# Altium footprint library csy.PcbLib: 198 footprints (part 7 of 13)
Each footprint in its own frame and in the unit in brackets; x right, y up, seen from the top. Pads: shape width x height; smd on the part's side, far side on the other; paste and mask are expansions set on the pad; w line width, h text height; cw(c..) or ccw(c..) is an arc to the next point about the centre after c.
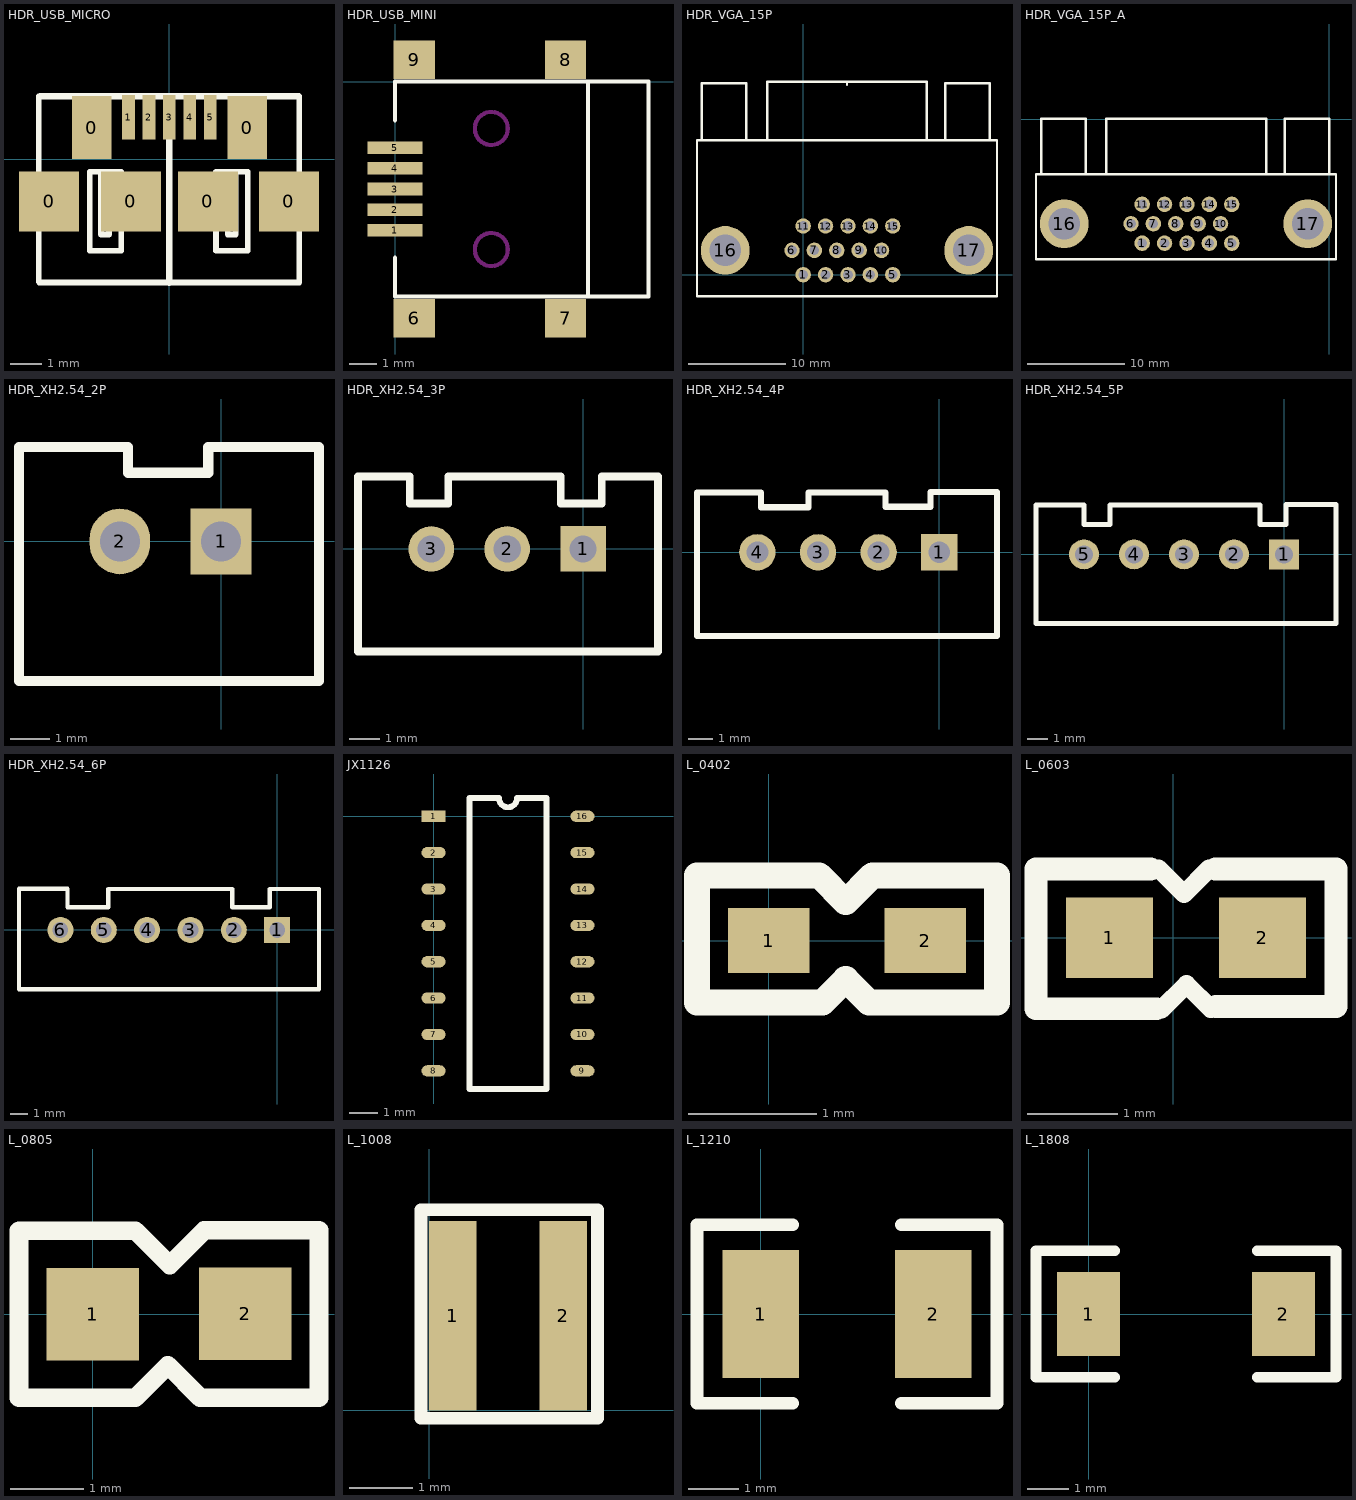
[diagram p6: the footprints below, top view; thin cyan lines are the x and y axes]

## HDR_USB_MICRO [mm]
pads (11):
  rect 1.9x1.9 smd: 0(-3.797,-1.333) 0(-1.206,-1.333) 0(1.232,-1.333) 0(3.797,-1.333)
  rect 1.25x2 smd: 0(-2.451,1.003) 0(2.476,1.003)
  rect 0.4x1.4 smd: 1(-1.283,1.333) 2(-0.635,1.333) 3(0.013,1.333) 4(0.66,1.333) 5(1.308,1.333)
Top Overlay:
  lines w0.178: -4.127,-3.873 -4.127,1.994 ; -4.102,-3.899 4.102,-3.899 ; -2.152,-0.394 -2.152,-2.379 -1.949,-2.379 -1.898,-2.379 -1.898,-0.394 ; 1.861,-0.394 1.861,-2.379 2.115,-2.379 2.115,-0.394 ; 4.127,-3.899 4.127,1.994 ; -2.513,-2.894 -2.513,-0.394 -1.513,-0.394 -1.513,-2.894 -2.513,-2.894 ; 1.487,-2.894 2.487,-2.894 2.487,-0.394 1.487,-0.394 1.487,-2.894
  lines w0.2: -4.077,1.994 4.102,1.994 ; 0.013,-3.91 0.013,1.968
3D body "MICRO USB.STEP": height 2.77, standoff -0.17, extent -4.1,-3.912 4.1,2.018

## HDR_USB_MINI [mm]
pads (9):
  rect 2x0.457 smd: 1(-0.014,-5.389) 2(-0.014,-4.639) 3(-0.014,-3.889) 4(-0.014,-3.139) 5(-0.014,-2.389)
  rect 1.5x1.4 smd: 6(0.686,-8.589) 7(6.186,-8.589) 8(6.186,0.811) 9(0.686,0.811)
Top Overlay:
  lines w0.15: -0.014,-6.389 -0.014,-7.789 6.586,-7.789 9.2,-7.789 9.2,0.011 6.586,0.011 -0.014,0.011 -0.014,-1.389 ; 7,-7.789 7,0.011
Keep-Out Layer:
  circle w0.15: c3.486,-1.689 r0.6
  circle w0.15: c3.486,-6.089 r0.6

## HDR_VGA_15P [mm]
pads (17):
  round 1.58 hole 1: 1(0,0) 2(2.3,0) 3(4.6,0) 4(6.9,0) 5(9.2,0) 6(-1.15,2.5) 7(1.15,2.5) 8(3.45,2.5) 9(5.75,2.5) 10(8.05,2.5) 11(0,5) 12(2.3,5) 13(4.6,5) 14(6.9,5) 15(9.2,5)
  round 5 hole 3.25: 16(-8,2.5) 17(17,2.5)
Top Overlay:
  lines w0.254: -10.9,-2.2 -10.9,13.8 19.9,13.8 19.9,-2.2 -10.89,-2.2 -10.9,-2.19 ; -10.4,13.8 -10.4,19.67 -5.83,19.67 -5.83,13.82 ; -3.7,13.8 -3.7,19.8 12.7,19.8 12.7,13.8 ; 4.5,19.5 4.5,19.8 ; 14.6,13.8 14.6,19.68 19.18,19.68 19.18,13.84
3D body "SW3dPS-Connector, D-Sub, 15 pin HD, RA, Receptacle.STEP": height 12.77, standoff -3.27, extent -11.055,-0.875 19.755,20.225

## HDR_VGA_15P_A [mm]
pads (17):
  round 1.58 hole 1: 1(-19.205,-12.725) 2(-16.905,-12.725) 3(-14.605,-12.725) 4(-12.305,-12.725) 5(-10.005,-12.725) 6(-20.355,-10.733) 7(-18.055,-10.733) 8(-15.755,-10.733) 9(-13.455,-10.733) 10(-11.155,-10.733) 11(-19.205,-8.741) 12(-16.905,-8.741) 13(-14.605,-8.741) 14(-12.305,-8.741) 15(-10.005,-8.741)
  round 5 hole 3.25: 16(-27.205,-10.733) 17(-2.205,-10.733)
Top Overlay:
  lines w0.254: -29.58,-5.664 -29.58,0.025 -25.01,0.025 -25.01,-5.664 ; -22.88,-5.588 -22.88,0.025 -6.48,0.025 -6.48,-5.664 ; -4.58,-5.639 -4.58,0.025 0,0.025 0,-5.639 ; -30.105,-14.354 0.695,-14.354 0.695,-5.664 -30.105,-5.664 -30.105,-14.354
3D body "User Library-SLIM D-SUB RIGHT ANGLE PCB MOUNT.step": height 10.25, standoff -3.09, extent -30.008,-13.801 0.792,-0.331

## HDR_XH2.54_2P [mil]
pads (2):
  rect 60x65 hole 39.37: 1(0,0)
  oval 60x65 hole 39.37: 2(-100.1,0)
Top Overlay:
  lines w10: -200,-138 97,-138 97,93.3 66.2,93.3 -12.6,93.3 -12.6,68 -92.1,68 -92.1,93.3 -200,93.3 -200,-138
3D body "sip2_n.stp": height 275.59, standoff -118.11, extent -197.64,-142.11 97.64,94.11

## HDR_XH2.54_3P [mm]
pads (3):
  rect 1.5x1.5 hole 0.9: 1(0,0)
  round 1.5 hole 0.9: 2(-2.5,0) 3(-5,0)
Top Overlay:
  lines w0.254: -7.413,-3.378 -7.413,2.388 -5.711,2.388 -5.711,1.5 -4.441,1.5 -4.441,2.388 -0.733,2.388 -0.733,1.5 0.613,1.5 0.613,2.388 2.468,2.388 2.468,-3.378 -7.413,-3.378
3D body "3pin-2.5.step": height 7, standoff -3.4, extent -7.41,-3.408 2.49,2.342

## HDR_XH2.54_4P [mm]
pads (4):
  rect 1.5x1.5 hole 0.9: 1(0,0)
  round 1.5 hole 0.9: 2(-2.5,0) 3(-5,0) 4(-7.5,0)
Top Overlay:
  lines w0.254: -9.989,-3.454 2.381,-3.454 2.381,2.489 -0.363,2.489 -0.363,1.88 -2.217,1.88 -2.217,2.464 -5.392,2.464 -5.392,1.854 -7.348,1.854 -7.348,2.464 -9.989,2.464 -9.989,-3.454
3D body "4pin-2.5.step": height 7, standoff -3.4, extent -9.966,-3.383 2.434,2.367

## HDR_XH2.54_5P [mm]
pads (5):
  rect 1.5x1.5 hole 0.9: 1(0,0)
  round 1.5 hole 0.9: 2(-2.5,0) 3(-5,0) 4(-7.5,0) 5(-10,0)
Top Overlay:
  lines w0.254: -8.7,2.438 -8.7,1.5 -10,1.5 -10,2.464 -12.4,2.464 -12.4,-3.454 2.6,-3.454 2.6,2.489 0.1,2.489 0.1,1.5 -1.2,1.5 -1.2,2.464 -8.7,2.464
3D body "User Library-jst-b5b-xh-a.STEP": height 7, standoff -3.4, extent -12.511,-3.388 2.519,2.362

## HDR_XH2.54_6P [mm]
pads (6):
  rect 1.5x1.5 hole 0.9: 1(0,0)
  round 1.5 hole 0.9: 2(-2.5,0) 3(-5,0) 4(-7.5,0) 5(-10,0) 6(-12.5,0)
Top Overlay:
  lines w0.254: -14.888,-3.429 2.41,-3.429 2.41,2.362 -0.435,2.362 -0.435,1.321 -2.594,1.321 -2.594,2.362 -9.731,2.362 -9.731,1.321 -12.094,1.321 -12.094,2.388 -14.888,2.388 -14.888,-3.429
3D body "6pin-2.5.step": height 7, standoff -3.4, extent -14.977,-3.383 2.423,2.367

## JX1126 [mm]
pads (16):
  rect 0.838x0.39 smd: 1(0,0)
  oval 0.838x0.39 smd: 2(0,-1.27) 3(0,-2.54) 4(0,-3.81) 5(0,-5.08) 6(0,-6.35) 7(0,-7.62) 8(0,-8.89) 9(5.2,-8.89) 10(5.2,-7.62) 11(5.2,-6.35) 12(5.2,-5.08) 13(5.2,-3.81) 14(5.2,-2.54) 15(5.2,-1.27) 16(5.2,0)
Top Overlay:
  lines w0.2: 1.254,-9.525 1.254,0.635 2.282,0.635 ccw(c2.6,0.635) 2.917,0.635 3.946,0.635 3.946,-9.525 1.254,-9.525

## L_0402 [mil]
pads (2):
  rect 25x20 smd: 1(0,0) 2(48,0)
Top Overlay:
  lines w8: -22,-19 16.43,-19 23.62,-11.81 30.81,-19 70,-19 70,20 31.81,20 23.62,11.81 15.43,20 -22,20 -22,-19
3D body: height 10, standoff 0, extent 8,-10 41,10
3D body: height 10, standoff 0, extent 5,-10 8,10
3D body: height 10, standoff 0, extent 41,-10 44,10

## L_0603 [mil]
pads (2):
  rect 38x35 smd: 1(-28,0) 2(38.87,0)
Top Overlay:
  lines w8: -6.53,30.27 4.6,19.14 15.58,30.12 ; -5.3,-31.36 5.7,-20.36 16.32,-30.98
  lines w10: -9.9,30 -60,30 -60,-31 -7.3,-31 ; 18.4,30 71,30 71,-30 18.6,-30
3D body: height 20, standoff 0, extent -16,-15 28,15
3D body: height 20, standoff 0, extent 28,-15 36,15
3D body: height 20, standoff 0, extent -24,-15 -16,15

## L_0805 [mm]
pads (2):
  rect 1.27x1.27 smd: 1(0,0) 2(2.09,0.005)
Top Overlay:
  lines w0.254: -1.011,-1.143 -1.011,1.143 0.584,1.143 1.054,0.673 1.529,1.148 3.099,1.148 3.099,-1.143 1.473,-1.143 1.029,-0.699 0.584,-1.143 -1.011,-1.143
3D body "R0805.STEP": height 0.55, standoff 0, extent 0.036,-0.62 2.036,0.64

## L_1008 [mm] "LQH2H系列"
pads (2):
  rect 0.75x3 smd: 1(0.375,1.5) 2(2.125,1.5)
Top Overlay:
  lines w0.203: -0.127,-0.127 2.667,-0.127 2.667,3.175 -0.127,3.175 -0.127,-0.127

## L_1210 [mil]
pads (2):
  rect 60x100 smd: 1(0,0) 2(135,0)
Top Overlay:
  lines w10: 25,-70 -50,-70 -50,70 25,70 ; 110,-70 185,-70 185,70 110,70
3D body "L1210.STEP": height 78.74, standoff 0, extent 7.09,-51.96 131.11,46.48

## L_1808 [mil]
pads (2):
  rect 60x80 smd: 1(0,0) 2(185,0)
Top Overlay:
  lines w10: 25,-60 -50,-60 -50,60 25,60 ; 160,-60 235,-60 235,60 160,60
3D body "R1808(4520M)1.STEP": height 39.37, standoff 0, extent 2,-39 179.77,37.49